# Altium footprint library Miscellaneous SMD.PcbLib: 82 footprints (part 4 of 7) (continued)
## JAE_DP3AR020SU32JQ1R400 [mm] "20 Positions, 0.6mm Pitch, ThunderboltTM Technology Compatible Right Angled Connector"
height 9.1
pads (26):
  rect 0.35x2 smd: 1(2.7,6) 3(2.1,6) 5(1.5,6) 7(0.9,6) 9(0.3,6) 11(-0.3,6) 13(-0.9,6) 15(-1.5,6) 17(-2.1,6) 19(-2.7,6)
  round 0.8 hole 0.5: 2(2.7,3.09) 4(2.3,2.09) 6(1.3,2.09) 8(0.9,3.09) 10(0.5,4.09) 12(-0.5,4.09) 14(-0.9,3.09) 16(-1.3,2.09) 18(-2.3,2.09) 20(-2.7,3.09)
  round 0.5 hole 1.4 unplated mask+0.45: P1(-4,0) P2(4,0)
  oval 1.2x2.3 hole 0.7 slot 1.8 at 90 deg: SHIELD(-4.56,-2.72) SHIELD(4.56,-2.72)
  oval 1.2x2.7 hole 0.7 slot 2.2 at 90 deg: SHIELD(-4.26,3.09) SHIELD(4.26,3.09)
Top Layer keep-out:
  lines w0.1: -5.1,-1.45 cw(c-4.56,-2.17) -3.912,-1.545 -3.54,-1.545 -3.54,-0.888 cw(c-4,0) -4.606,-0.795 -5.1,-0.795 -5.1,-1.45 ; -5.1,4.525 -4.844,4.525 cw(c-4.26,3.84) -3.75,4.582 -3.75,5.785 -5.1,5.785 -5.1,4.525 ; 3.54,-1.545 3.913,-1.545 cw(c4.56,-2.17) 5.1,-1.45 5.1,-0.795 4.607,-0.795 cw(c4,0) 3.54,-0.888 3.54,-1.545 ; 3.75,4.582 cw(c4.26,3.84) 4.844,4.525 5.1,4.525 5.1,5.785 3.75,5.785 3.75,4.582
Top Overlay:
  circle w0.25: c3.45,6.905 r0.125
  lines w0.2: -4.925,-1.239 -4.925,-0.595 ; -4.925,0.595 -4.925,1.593 ; -4.925,4.587 -4.925,5.9 -4.576,5.9 ; -4.61,4.777 -4.61,5.7 cw(c-4.01,5.7) -4.01,6.3 -3.275,6.3 ; -4.57,-4.27 -4.57,-5.02 ccw(c-4.17,-5.02) -4.17,-5.42 ; -4.21,4.839 -4.21,5.7 cw(c-4.01,5.7) -4.1,5.879 ; -4.15,-4.182 -4.15,-5.52 4.15,-5.52 4.15,-4.182 ; -4.15,-1.258 -4.15,-1.09 ; -4.15,1.09 -4.15,1.346 ; -4.1,4.827 -4.1,5.9 -3.275,5.9 ; 3.275,5.9 4.1,5.9 4.1,4.827 ; 3.275,6.3 4.01,6.3 cw(c4.01,5.7) 4.61,5.7 4.61,4.777 ; 4.1,5.879 cw(c4.01,5.7) 4.21,5.7 4.21,4.839 ; 4.15,-1.258 4.15,-1.09 ; 4.15,1.09 4.15,1.346 ; 4.17,-5.42 ccw(c4.17,-5.02) 4.57,-5.02 4.57,-4.27 ; 4.576,5.9 4.925,5.9 4.925,4.587 ; 4.925,-1.239 4.925,-0.595 ; 4.925,0.595 4.925,1.593 ; -3.001,-4.473 ccw(c-2.807,-4.52) -2.613,-4.567 -2.1,-2.47 -2.1,-0.84 -1.4,-0.84 -1.4,-2.47 -0.887,-4.567 ccw(c-0.693,-4.52) -0.499,-4.473 -1,-2.413 -1,-0.64 ccw(c-1.2,-0.64) -1.2,-0.44 -2.3,-0.44 ccw(c-2.3,-0.64) -2.5,-0.64 -2.5,-2.413 -3.001,-4.473 ; 0.499,-4.473 ccw(c0.693,-4.52) 0.887,-4.567 1.4,-2.47 1.4,-0.84 2.1,-0.84 2.1,-2.47 2.613,-4.567 ccw(c2.807,-4.52) 3.001,-4.473 2.5,-2.413 2.5,-0.64 ccw(c2.3,-0.64) 2.3,-0.44 1.2,-0.44 ccw(c1.2,-0.64) 1,-0.64 1,-2.413 0.499,-4.473
Mechanical 8:
  drawing of 224 lines, arcs and shapes, not listed
Mechanical 14:
  circle w0.25: c3.45,6.905 r0.125
  lines w0.1: -4.576,5.9 -4.925,5.9 -4.925,-1.37 -4.15,-1.37 ; -4.57,-3.22 -4.76,-3.22 -4.76,-2.22 -4.17,-2.22 -4.17,-5.02 -4.15,-5.02 ; -4.57,-2.22 -4.57,-5.02 ccw(c-4.17,-5.02) -4.17,-5.42 ; -4.145,3.418 -3.25,3.42 ccw(c-3.25,3.62) -3.05,3.62 -3.05,5.149 cw(c-2.85,5.149) -2.991,5.291 -2.732,5.55 -2.394,5.983 -2.355,6.126 -2.355,6.175 -2.366,6.202 -2.394,6.228 -2.503,6.278 -2.612,6.299 ; -4.1,3.42 -4.1,5.9 -2.458,5.9 ; -4.1,5.786 ccw(c-3.865,5.6) -4.15,5.694 -4.15,-5.52 4.15,-5.52 4.15,5.694 ccw(c3.865,5.6) 3.865,5.9 ; -4.1,5.879 ccw(c-4.01,5.7) -4.21,5.7 -4.21,3.08 -4.61,3.08 -4.61,5.7 cw(c-4.01,5.7) -4.01,6.3 4.01,6.3 cw(c4.01,5.7) 4.61,5.7 4.61,3.08 4.21,3.08 4.21,5.7 ccw(c4.01,5.7) 4.1,5.879 ; -2.825,6.3 -2.825,6.5 -2.575,6.5 -2.575,6.3 ; -2.225,6.3 -2.225,6.5 -1.975,6.5 -1.975,6.3 ; -1.723,5.9 1.722,5.9 ; -1.625,6.3 -1.625,6.5 -1.375,6.5 -1.375,6.3 ; -1.549,6.3 -1.67,6.282 -1.791,6.228 -1.82,6.178 -1.83,6.124 -1.831,6.062 -1.791,5.983 -1.622,5.777 -1.453,5.55 -1.356,5.454 ccw(c-1.215,5.595) -1.215,5.395 1.215,5.395 ccw(c1.215,5.595) 1.356,5.454 1.646,5.808 1.791,5.983 1.824,6.041 1.83,6.124 1.82,6.174 1.791,6.228 1.67,6.282 1.549,6.3 ; -1.025,6.3 -1.025,6.5 -0.775,6.5 -0.775,6.3 ; -0.425,6.3 -0.425,6.5 -0.175,6.5 -0.175,6.3 ; 0.175,6.3 0.175,6.5 0.425,6.5 0.425,6.3 ; 0.775,6.3 0.775,6.5 1.025,6.5 1.025,6.3 ; 1.375,6.3 1.375,6.5 1.625,6.5 1.625,6.3 ; 1.975,6.3 1.975,6.5 2.225,6.5 2.225,6.3 ; 2.462,5.9 4.1,5.9 4.1,3.42 ; 2.575,6.3 2.575,6.5 2.825,6.5 2.825,6.3 ; 2.641,6.3 2.503,6.278 2.394,6.228 2.362,6.193 2.353,6.155 2.357,6.096 2.394,5.983 2.563,5.777 2.732,5.55 2.862,5.42 2.991,5.291 cw(c2.85,5.149) 3.05,5.149 3.05,3.62 ccw(c3.25,3.62) 3.25,3.42 4.15,3.42 ; 4.15,-5.02 4.17,-5.02 4.17,-2.22 4.76,-2.22 4.76,-3.22 4.57,-3.22 ; 4.15,-1.37 4.925,-1.37 4.925,5.9 4.576,5.9 ; 4.17,-5.42 ccw(c4.17,-5.02) 4.57,-5.02 4.57,-2.22 ; -3.001,-4.473 ccw(c-2.807,-4.52) -2.613,-4.567 -2.1,-2.47 -2.1,-0.84 -1.4,-0.84 -1.4,-2.47 -0.887,-4.567 ccw(c-0.693,-4.52) -0.499,-4.473 -1,-2.413 -1,-0.64 ccw(c-1.2,-0.64) -1.2,-0.44 -2.3,-0.44 ccw(c-2.3,-0.64) -2.5,-0.64 -2.5,-2.413 -3.001,-4.473 ; 0.499,-4.473 ccw(c0.693,-4.52) 0.887,-4.567 1.4,-2.47 1.4,-0.84 2.1,-0.84 2.1,-2.47 2.613,-4.567 ccw(c2.807,-4.52) 3.001,-4.473 2.5,-2.413 2.5,-0.64 ccw(c2.3,-0.64) 2.3,-0.44 1.2,-0.44 ccw(c1.2,-0.64) 1,-0.64 1,-2.413 0.499,-4.473
Mechanical 15:
  lines w0.05: -5.175,-5.77 -5.175,7.25 5.175,7.25 5.175,-5.77 -5.175,-5.77
3D body "JAE_DP3AR020SU32JQ1R400.stp": height 5.9, standoff -2.55, extent -4.925,-5.52 4.925,6.5

## JAE_DP3R020RU32JQR400 [mm] "20 Positions, 0.6mm Pitch, ThunderboltTM Technology Compatible Right Angled Connector (Reverse Type)"
height 9.1
pads (26):
  round 0.8 hole 0.5: 1(-2.7,3.09) 3(-2.3,2.09) 5(-1.3,2.09) 7(-0.9,3.09) 9(-0.5,4.09) 11(0.5,4.09) 13(0.9,3.09) 15(1.3,2.09) 17(2.3,2.09) 19(2.7,3.09)
  rect 0.35x2 smd: 2(-2.7,6) 4(-2.1,6) 6(-1.5,6) 8(-0.9,6) 10(-0.3,6) 12(0.3,6) 14(0.9,6) 16(1.5,6) 18(2.1,6) 20(2.7,6)
  round 0.5 hole 1.4 unplated mask+0.45: P1(-4,0) P2(4,0)
  oval 1.2x2.3 hole 0.7 slot 1.8 at 90 deg: SHIELD(-4.56,-2.72) SHIELD(4.56,-2.72)
  oval 1.2x2.7 hole 0.7 slot 2.2 at 90 deg: SHIELD(-4.26,3.09) SHIELD(4.26,3.09)
Top Layer keep-out:
  lines w0.1: -5.1,-1.45 cw(c-4.56,-2.17) -3.912,-1.545 -3.54,-1.545 -3.54,-0.888 cw(c-4,0) -4.606,-0.795 -5.1,-0.795 -5.1,-1.45 ; -5.1,4.525 -4.844,4.525 cw(c-4.26,3.84) -3.75,4.582 -3.75,5.785 -5.1,5.785 -5.1,4.525 ; 3.54,-1.545 3.913,-1.545 cw(c4.56,-2.17) 5.1,-1.45 5.1,-0.795 4.607,-0.795 cw(c4,0) 3.54,-0.888 3.54,-1.545 ; 3.75,4.582 cw(c4.26,3.84) 4.844,4.525 5.1,4.525 5.1,5.785 3.75,5.785 3.75,4.582
Top Overlay:
  circle w0.25: c3.45,6.905 r0.125
  lines w0.2: -4.925,-1.239 -4.925,-0.595 ; -4.925,0.595 -4.925,1.593 ; -4.925,4.587 -4.925,5.9 -4.576,5.9 ; -4.61,4.777 -4.61,5.7 cw(c-4.01,5.7) -4.01,6.3 -3.275,6.3 ; -4.57,-4.27 -4.57,-5.02 ccw(c-4.17,-5.02) -4.17,-5.42 ; -4.21,4.839 -4.21,5.7 cw(c-4.01,5.7) -4.1,5.879 ; -4.17,-4.191 -4.17,-5.02 -4.15,-5.02 ; -4.15,-4.182 -4.15,-5.52 4.15,-5.52 4.15,-4.182 ; -4.15,-1.258 -4.15,-1.09 ; -4.15,1.09 -4.15,1.346 ; -4.1,4.827 -4.1,5.9 -3.275,5.9 ; 3.275,5.9 4.1,5.9 4.1,4.827 ; 3.275,6.3 4.01,6.3 cw(c4.01,5.7) 4.61,5.7 4.61,4.777 ; 4.1,5.879 cw(c4.01,5.7) 4.21,5.7 4.21,4.839 ; 4.15,-5.02 4.17,-5.02 4.17,-4.191 ; 4.15,-1.258 4.15,-1.09 ; 4.15,1.09 4.15,1.346 ; 4.17,-5.42 ccw(c4.17,-5.02) 4.57,-5.02 4.57,-4.27 ; 4.576,5.9 4.925,5.9 4.925,4.587 ; 4.925,-1.37 4.925,-0.595 ; 4.925,0.595 4.925,1.593 ; -1.3,-3.52 ccw(c-0.3,-3.52) -0.3,-4.52 0.3,-4.52 ccw(c0.3,-3.52) 1.3,-3.52 1.3,0.08 ccw(c1.1,0.08) 1.1,0.28 1.061,0.28 ccw(c1.061,0.08) 0.865,0.123 0.5,-1.52 0.5,-1.62 ccw(c0.7,-1.62) 0.7,-1.82 cw(c0.7,-2.02) 0.9,-2.02 0.9,-3.97 -0.9,-3.97 -0.9,-2.02 cw(c-0.7,-2.02) -0.7,-1.82 ccw(c-0.7,-1.62) -0.5,-1.62 -0.5,-1.52 -0.865,0.123 ccw(c-1.06,0.08) -1.06,0.28 -1.1,0.28 ccw(c-1.1,0.08) -1.3,0.08 -1.3,-3.52
Mechanical 8:
  drawing of 224 lines, arcs and shapes, not listed
Mechanical 14:
  circle w0.25: c3.45,6.905 r0.125
  lines w0.1: -4.576,5.9 -4.925,5.9 -4.925,-1.37 -4.15,-1.37 ; -4.57,-3.22 -4.76,-3.22 -4.76,-2.22 -4.17,-2.22 -4.17,-5.02 -4.15,-5.02 ; -4.57,-2.22 -4.57,-5.02 ccw(c-4.17,-5.02) -4.17,-5.42 ; -4.1,5.786 ccw(c-3.865,5.6) -4.15,5.694 -4.15,-5.52 4.15,-5.52 4.15,5.694 ccw(c3.865,5.6) 3.865,5.9 ; -4.1,5.879 ccw(c-4.01,5.7) -4.21,5.7 -4.21,3.08 -4.61,3.08 -4.61,5.7 cw(c-4.01,5.7) -4.01,6.3 4.01,6.3 cw(c4.01,5.7) 4.61,5.7 4.61,3.08 4.21,3.08 4.21,5.7 ccw(c4.01,5.7) 4.1,5.879 ; -2.825,6.3 -2.825,6.5 -2.575,6.5 -2.575,6.3 ; -2.225,6.3 -2.225,6.5 -1.975,6.5 -1.975,6.3 ; -2.1,5.9 -4.1,5.9 -4.1,3.42 -2.75,3.42 ccw(c-2.75,3.62) -2.55,3.62 -2.55,4.95 cw(c-2.342,4.947) -2.3,5.15 ccw(c-2.3,5.35) -2.1,5.35 -2.1,6.3 ; -1.625,6.3 -1.625,6.5 -1.375,6.5 -1.375,6.3 ; -1.1,5.9 1.1,5.9 ; -1.1,6.3 -1.1,5.3 ccw(c-0.95,5.3) -0.95,5.15 0.95,5.15 ccw(c0.95,5.3) 1.1,5.3 1.1,6.3 ; -1.025,6.3 -1.025,6.5 -0.775,6.5 -0.775,6.3 ; -0.425,6.3 -0.425,6.5 -0.175,6.5 -0.175,6.3 ; 0.175,6.3 0.175,6.5 0.425,6.5 0.425,6.3 ; 0.775,6.3 0.775,6.5 1.025,6.5 1.025,6.3 ; 1.375,6.3 1.375,6.5 1.625,6.5 1.625,6.3 ; 1.975,6.3 1.975,6.5 2.225,6.5 2.225,6.3 ; 2.1,5.9 4.1,5.9 4.1,3.42 2.75,3.42 cw(c2.75,3.62) 2.55,3.62 2.55,4.944 ; 2.1,6.3 2.1,5.35 ccw(c2.3,5.35) 2.3,5.15 cw(c2.343,4.947) 2.55,4.95 ; 2.575,6.3 2.575,6.5 2.825,6.5 2.825,6.3 ; 4.15,-5.02 4.17,-5.02 4.17,-2.22 4.76,-2.22 4.76,-3.22 4.57,-3.22 ; 4.15,-1.37 4.925,-1.37 4.925,5.9 4.576,5.9 ; 4.17,-5.42 ccw(c4.17,-5.02) 4.57,-5.02 4.57,-2.22 ; -1.3,-3.52 ccw(c-0.3,-3.52) -0.3,-4.52 0.3,-4.52 ccw(c0.3,-3.52) 1.3,-3.52 1.3,0.08 ccw(c1.1,0.08) 1.1,0.28 1.061,0.28 ccw(c1.061,0.08) 0.865,0.123 0.5,-1.52 0.5,-1.62 ccw(c0.7,-1.62) 0.7,-1.82 cw(c0.7,-2.02) 0.9,-2.02 0.9,-3.97 -0.9,-3.97 -0.9,-2.02 cw(c-0.7,-2.02) -0.7,-1.82 ccw(c-0.7,-1.62) -0.5,-1.62 -0.5,-1.52 -0.865,0.123 ccw(c-1.06,0.08) -1.06,0.28 -1.1,0.28 ccw(c-1.1,0.08) -1.3,0.08 -1.3,-3.52
Mechanical 15:
  lines w0.05: -5.175,-5.77 -5.175,7.25 5.175,7.25 5.175,-5.77 -5.175,-5.77
3D body "JAE_DP3R020RU32JQR400.stp": height 5.9, standoff -1.85, extent -4.925,-5.52 4.925,6.5

## JAE_KX15-20K4DE1000E [mm] "0.8mm Pitch, 20 Contacts Surface Mount Board to Board & Mezzanine Plug Connector"
height 6.05
pads (24):
  rect 0.5x2.1 smd: 1(-3.6,-2.25) 2(-3.6,2.25) 3(-2.8,-2.25) 4(-2.8,2.25) 5(-2,-2.25) 6(-2,2.25) 7(-1.2,-2.25) 8(-1.2,2.25) 9(-0.4,-2.25) 10(-0.4,2.25) 11(0.4,-2.25) 12(0.4,2.25) 13(1.2,-2.25) 14(1.2,2.25) 15(2,-2.25) 16(2,2.25) 17(2.8,-2.25) 18(2.8,2.25) 19(3.6,-2.25) 20(3.6,2.25)
  rect 2.5x3 smd: 21(8.1,0) 22(-8.1,0)
  round 0.5 hole 0.7 unplated mask+0.1: 23(4.35,0)
  round 0.5 hole 0.9 unplated mask+0.2: 24(-4.35,0)
Top Overlay:
  circle w0.25: c-4.65,-2.95 r0.125
  lines w0.2: -8,-1.9 -8,-2 ccw(c-7.5,-2) -7.5,-2.5 -6.55,-2.5 -6.55,-1.9 ; -8,1.9 -8,2 cw(c-7.5,2) -7.5,2.5 -6.55,2.5 -6.55,1.9 ; -6.55,-2.05 -4.25,-2.05 ; -6.55,2.05 -4.25,2.05 ; -6.45,-0.15 -5.8,-0.15 ; -6.45,1.25 -5.8,1.25 ; -5.712,-0.862 -5.3,-0.45 ; -5.712,1.962 -5.3,1.55 ; -5.5,2.05 ccw(c-5.5,1.75) -5.8,1.75 -5.8,-0.65 ccw(c-5.5,-0.65) -5.5,-0.95 -4.6,-0.95 -4.6,-1.85 ; -5,-0.374 -5,-0.95 -5.1,-0.45 ; -5,0.374 -5,1.85 ; -5,2.05 -5.1,1.55 ; -4.96,2.05 -5,1.85 ; -4.8,-0.95 -4.8,-2.05 -4.6,-1.85 ; -4.525,-0.729 -4.525,-1.375 ; -4.525,0.729 -4.525,1.375 ; -4.25,-1.85 -4.6,-1.85 ; -4.25,-1.375 -4.525,-1.375 ; -4.25,-1.225 -4.502,-1.225 -4.525,-1.375 ; -4.25,1.225 -4.502,1.225 -4.525,1.375 ; -4.25,1.375 -4.525,1.375 ; -4.25,1.85 -5,1.85 ; 4.25,-2.05 6.55,-2.05 ; 4.25,-1.85 4.6,-1.85 ; 4.25,-1.375 4.525,-1.375 ; 4.25,-1.225 4.502,-1.225 4.525,-1.375 ; 4.25,1.225 4.502,1.225 4.525,1.375 ; 4.25,1.375 4.525,1.375 ; 4.25,1.85 5,1.85 ; 4.25,2.05 6.55,2.05 ; 4.525,-0.729 4.525,-1.375 ; 4.525,0.729 4.525,1.375 ; 4.8,-0.95 4.8,-2.05 4.6,-1.85 ; 4.96,2.05 5,1.85 ; 5,-0.374 5,-0.95 5.1,-0.45 ; 5,0.374 5,1.85 ; 5,2.05 5.1,1.55 ; 5.476,2.049 cw(c5.5,1.75) 5.8,1.75 5.8,-0.65 cw(c5.5,-0.65) 5.5,-0.95 4.6,-0.95 4.6,-1.85 ; 5.712,-0.862 5.3,-0.45 ; 5.712,1.962 5.3,1.55 ; 5.8,-0.15 6.45,-0.15 ; 5.8,1.25 6.45,1.25 ; 6.55,-1.9 6.55,-2.5 7.5,-2.5 ccw(c7.5,-2) 8,-2 8,-1.9 ; 6.55,1.9 6.55,2.5 7.5,2.5 cw(c7.5,2) 8,2 8,1.9 ; -5.3,-0.45 -5.3,1.55 ; -5.3,-0.45 -5.1,-0.45 ; -5.3,1.55 -5.1,1.55 ; -5.1,-0.45 -5.1,1.55 ; 5.1,-0.45 5.1,1.55 ; 5.1,-0.45 5.3,-0.45 ; 5.1,1.55 5.3,1.55 ; 5.3,-0.45 5.3,1.55
Mechanical 8:
  drawing of 192 lines, arcs and shapes, not listed
Mechanical 14:
  circle w0.25: c-4.65,-2.95 r0.125
  lines w0.1: -8,-0.95 -8.7,-0.95 -8.7,0.95 -8,0.95 ; -6.55,-2.05 6.55,-2.05 ; -6.55,2.05 6.55,2.05 ; -5.8,-0.15 -6.55,-0.15 -6.55,-2.5 -7.5,-2.5 cw(c-7.5,-2) -8,-2 -8,2 cw(c-7.5,2) -7.5,2.5 -6.55,2.5 -6.55,1.25 -5.8,1.25 ; -5.712,-0.862 -5.3,-0.45 ; -5.712,1.962 -5.3,1.55 ; -5.5,2.05 ccw(c-5.5,1.75) -5.8,1.75 -5.8,-0.65 ccw(c-5.5,-0.65) -5.5,-0.95 -4.6,-0.95 -4.6,-1.85 ; -5,2.05 -5.1,1.55 ; -4.96,2.05 -5,1.85 ; -4.8,-0.95 -4.8,-2.05 -4.6,-1.85 ; -4.225,-1.225 -4.225,1.225 ; -4.225,-1.025 4.225,-1.025 ; -4.225,1.025 4.225,1.025 ; -3.725,-2.05 -3.725,-2.75 -3.475,-2.75 -3.475,-2.05 ; -3.725,2.05 -3.725,2.75 -3.475,2.75 -3.475,2.05 ; -2.925,-2.05 -2.925,-2.75 -2.675,-2.75 -2.675,-2.05 ; -2.925,2.05 -2.925,2.75 -2.675,2.75 -2.675,2.05 ; -2.125,-2.05 -2.125,-2.75 -1.875,-2.75 -1.875,-2.05 ; -2.125,2.05 -2.125,2.75 -1.875,2.75 -1.875,2.05 ; -1.325,-2.05 -1.325,-2.75 -1.075,-2.75 -1.075,-2.05 ; -1.325,2.05 -1.325,2.75 -1.075,2.75 -1.075,2.05 ; -0.525,-2.05 -0.525,-2.75 -0.275,-2.75 -0.275,-2.05 ; -0.525,2.05 -0.525,2.75 -0.275,2.75 -0.275,2.05 ; 0.275,-2.05 0.275,-2.75 0.525,-2.75 0.525,-2.05 ; 0.275,2.05 0.275,2.75 0.525,2.75 0.525,2.05 ; 1.075,-2.05 1.075,-2.75 1.325,-2.75 1.325,-2.05 ; 1.075,2.05 1.075,2.75 1.325,2.75 1.325,2.05 ; 1.875,-2.05 1.875,-2.75 2.125,-2.75 2.125,-2.05 ; 1.875,2.05 1.875,2.75 2.125,2.75 2.125,2.05 ; 2.675,-2.05 2.675,-2.75 2.925,-2.75 2.925,-2.05 ; 2.675,2.05 2.675,2.75 2.925,2.75 2.925,2.05 ; 3.475,-2.05 3.475,-2.75 3.725,-2.75 3.725,-2.05 ; 3.475,2.05 3.475,2.75 3.725,2.75 3.725,2.05 ; 4.225,-1.225 4.225,1.225 ; 4.8,-0.95 4.8,-2.05 4.6,-1.85 ; 4.96,2.05 5,1.85 ; 5,2.05 5.1,1.55 ; 5.476,2.049 cw(c5.5,1.75) 5.8,1.75 5.8,-0.65 cw(c5.5,-0.65) 5.5,-0.95 4.6,-0.95 4.6,-1.85 ; 5.712,-0.862 5.3,-0.45 ; 5.712,1.962 5.3,1.55 ; 5.8,-0.15 6.55,-0.15 6.55,-2.5 7.5,-2.5 ccw(c7.5,-2) 8,-2 8,2 ccw(c7.5,2) 7.5,2.5 6.55,2.5 6.55,1.25 5.8,1.25 ; 8,-0.95 8.7,-0.95 8.7,0.95 8,0.95 ; -5.3,-0.45 -5.3,1.55 ; -5.3,-0.45 -5.1,-0.45 ; -5.3,1.55 -5.1,1.55 ; -5.1,-0.45 -5,-0.95 -5,1.85 ; -5.1,-0.45 -5.1,1.55 ; -5,1.85 5,1.85 ; -4.6,-1.85 4.6,-1.85 ; -4.525,-1.375 -4.502,-1.225 4.502,-1.225 4.525,-1.375 ; -4.525,-1.375 4.525,-1.375 ; -4.525,-1.375 -4.525,1.375 ; -4.525,1.375 -4.502,1.225 4.502,1.225 4.525,1.375 ; -4.525,1.375 4.525,1.375 ; 4.525,-1.375 4.525,1.375 ; 5,1.85 5,-0.95 5.1,-0.45 ; 5.1,-0.45 5.1,1.55 ; 5.1,-0.45 5.3,-0.45 ; 5.1,1.55 5.3,1.55 ; 5.3,-0.45 5.3,1.55
Mechanical 15:
  lines w0.05: -9.6,-3.55 -9.6,3.55 9.6,3.55 9.6,-3.55 -9.6,-3.55
3D body "JAE_KX15-20K4DE1000E.stp": height 5.75, standoff -0.6, extent -8.7,-2.75 8.7,2.75

## JOHNSON_142-0701-871 [mm] "SMA End Launch Straight Bulkhead Jack Receptacle - Round Contact"
height 8.05
pads (5):
  rect 5x2.794 smd: 1(0,0)
  rect 5x2.4 smd: 2(0,-4.317) 2(0,4.317)
  rect 5x2.4 smd far side: 2(0,-4.317) 2(0,4.317)
Top Overlay:
  lines w0.2: -14.73,-2.5 -15.526,-2.5 -15.526,2.5 -14.73,2.5 ; -5.85,-2.5 -4.35,-2.5 ; -5.85,2.5 -4.35,2.5 ; -14.38,-3.11 -14.38,3.11 ; -14.38,-3.11 -14.73,-2.51 -14.73,2.51 -14.38,3.11 ; -14.38,-3.11 -6.2,-3.11 ; -14.38,3.11 -6.2,3.11 ; -6.2,-3.11 -6.2,3.11 ; -6.2,-3.11 -5.85,-2.51 -5.85,2.51 -6.2,3.11 ; -4.35,-4.825 -2.7,-4.825 -2.7,4.825 -4.35,4.825 -4.35,-4.825
Mechanical 8:
  lines w0.1: -1,-4.317 0,-4.317 ; -1,0 0,0 ; -1,4.317 0,4.317 ; 0,-5.317 0,-4.317 ; 0,-3.317 0,-4.317 ; 0,-1 0,0 ; 0,1 0,0 ; 0,3.317 0,4.317 ; 0,5.317 0,4.317 ; 1,-4.317 0,-4.317 ; 1,0 0,0 ; 1,4.317 0,4.317
Mechanical 14:
  lines w0.1: -14.73,-2.5 -15.526,-2.5 -15.526,2.5 -14.73,2.5 ; -5.85,-2.5 -4.35,-2.5 ; -5.85,2.5 -4.35,2.5 ; -2.7,-3.809 2.05,-3.809 2.05,-4.825 -2.7,-4.825 ; -2.7,-0.381 2.054,-0.381 2.054,0.381 -2.696,0.381 ; -2.7,3.809 2.05,3.809 2.05,4.825 -2.7,4.825 ; -14.38,-3.11 -14.38,3.11 ; -14.38,-3.11 -14.73,-2.51 -14.73,2.51 -14.38,3.11 ; -14.38,-3.11 -6.2,-3.11 ; -14.38,3.11 -6.2,3.11 ; -6.2,-3.11 -6.2,3.11 ; -6.2,-3.11 -5.85,-2.51 -5.85,2.51 -6.2,3.11 ; -2.7,-4.825 -2.7,4.825 ; -2.7,-4.825 -4.35,-4.825 -4.35,4.825 -2.7,4.825
3D body "JOHNSON_142-0701-871_Part2.stp": height 5.56, standoff -4.64, extent -10.13,-5.1 -7.11,5.1
3D body "JOHNSON_142-0701-871_Part1.stp": height 4.48, standoff -3.57, extent -15.526,-4.825 2.054,4.825

## JOHNSON_142-0701-873 [mm] "SMA End Launch Straight Bulkhead Jack Receptacle - Round Contact"
height 8.05
pads (5):
  rect 5x2.794 smd: 1(0,0)
  rect 5x2.4 smd: 2(0,-4.317) 2(0,4.317)
  rect 5x2.4 smd far side: 2(0,-4.317) 2(0,4.317)
Top Overlay:
  lines w0.2: -14.73,-2.5 -15.526,-2.5 -15.526,2.5 -14.73,2.5 ; -5.85,-2.5 -4.35,-2.5 ; -5.85,2.5 -4.35,2.5 ; -14.38,-3.11 -14.38,3.11 ; -14.38,-3.11 -14.73,-2.51 -14.73,2.51 -14.38,3.11 ; -14.38,-3.11 -6.2,-3.11 ; -14.38,3.11 -6.2,3.11 ; -6.2,-3.11 -6.2,3.11 ; -6.2,-3.11 -5.85,-2.51 -5.85,2.51 -6.2,3.11 ; -4.35,-4.825 -2.7,-4.825 -2.7,4.825 -4.35,4.825 -4.35,-4.825
Mechanical 8:
  lines w0.1: -1,-4.317 0,-4.317 ; -1,0 0,0 ; -1,4.317 0,4.317 ; 0,-5.317 0,-4.317 ; 0,-3.317 0,-4.317 ; 0,-1 0,0 ; 0,1 0,0 ; 0,3.317 0,4.317 ; 0,5.317 0,4.317 ; 1,-4.317 0,-4.317 ; 1,0 0,0 ; 1,4.317 0,4.317
Mechanical 14:
  lines w0.1: -14.73,-2.5 -15.526,-2.5 -15.526,2.5 -14.73,2.5 ; -5.85,-2.5 -4.35,-2.5 ; -5.85,2.5 -4.35,2.5 ; -2.7,-3.809 2.05,-3.809 2.05,-4.825 -2.7,-4.825 ; -2.7,-0.381 2.054,-0.381 2.054,0.381 -2.696,0.381 ; -2.7,3.809 2.05,3.809 2.05,4.825 -2.7,4.825 ; -14.38,-3.11 -14.38,3.11 ; -14.38,-3.11 -14.73,-2.51 -14.73,2.51 -14.38,3.11 ; -14.38,-3.11 -6.2,-3.11 ; -14.38,3.11 -6.2,3.11 ; -6.2,-3.11 -6.2,3.11 ; -6.2,-3.11 -5.85,-2.51 -5.85,2.51 -6.2,3.11 ; -2.7,-4.825 -2.7,4.825 ; -2.7,-4.825 -4.35,-4.825 -4.35,4.825 -2.7,4.825
3D body "JOHNSON_142-0701-873_Part1.stp": height 4.48, standoff -3.57, extent -15.526,-4.825 2.054,4.825
3D body "JOHNSON_142-0701-873_Part2.stp": height 5.56, standoff -4.64, extent -9.75,-5.1 -7.53,5.1

## JOHNSON_142-0711-201 [mm] "SMA 50 Ohm Straight Jack Receptacle - Surface Mount"
height 8.84
pads (5):
  round 1.73 smd: 1(0,0)
  rect 2.35x1.9 smd: 2(-2.38,-2.6) 2(-2.38,2.6) 2(2.38,-2.6) 2(2.38,2.6)
Top Layer:
  region: 1.205,-3.555 3.555,-3.555 3.555,3.555 1.205,3.555 1.205,1.652 1.331,1.553 1.557,1.326 1.745,1.067 1.89,0.781 1.989,0.476 2.039,0.16 2.039,-0.16 1.989,-0.476 1.89,-0.781 1.745,-1.067 1.557,-1.326 1.331,-1.553 1.205,-1.652
  region: -3.555,-3.555 -1.205,-3.555 -1.205,-1.652 -1.331,-1.553 -1.557,-1.326 -1.745,-1.067 -1.89,-0.781 -1.989,-0.476 -2.039,-0.16 -2.039,0.16 -1.989,0.476 -1.89,0.781 -1.745,1.067 -1.557,1.326 -1.331,1.553 -1.205,1.652 -1.205,3.555 -3.555,3.555
Top Overlay:
  lines w0.2: -3.175,-0.905 -3.175,0.905 ; -2.491,-0.905 cw(c0,0) -2.491,0.905 ; -2.162,-0.78 cw(c0,0.005) -2.162,0.79 ; -0.905,-3.175 0.905,-3.175 ; -0.905,-2.491 ccw(c0,0) 0.905,-2.491 ; -0.905,2.491 cw(c0,0) 0.905,2.491 ; -0.905,3.175 0.905,3.175 ; -0.79,-2.162 ccw(c-0.005,0) 0.78,-2.162 ; -0.79,2.162 cw(c-0.005,0) 0.78,2.162 ; 2.162,-0.78 ccw(c0,0.005) 2.162,0.79 ; 2.491,-0.905 ccw(c0,0) 2.491,0.905 ; 3.175,-0.905 3.175,0.905
Top Solder:
  region: -3.655,-3.655 -3.655,-1.105 -1.601,-1.105 -1.549,-1.176 -1.436,-1.312 -1.312,-1.436 -1.176,-1.549 -1.105,-1.601 -1.105,-3.655
  region: 1.105,-3.655 1.105,-1.601 1.176,-1.549 1.312,-1.436 1.436,-1.312 1.549,-1.176 1.601,-1.105 3.655,-1.105 3.655,-3.655
  region: -3.655,1.105 -1.601,1.105 -1.549,1.176 -1.436,1.312 -1.312,1.436 -1.176,1.549 -1.105,1.601 -1.105,3.655 -3.655,3.655
  region: 1.105,1.601 1.176,1.549 1.312,1.436 1.436,1.312 1.549,1.176 1.601,1.105 3.655,1.105 3.655,3.655 1.105,3.655
Mechanical 8:
  lines w0.1: -3.38,-2.38 -2.38,-2.38 ; -3.38,2.38 -2.38,2.38 ; -2.38,-3.38 -2.38,-2.38 ; -2.38,-1.38 -2.38,-2.38 ; -2.38,1.38 -2.38,2.38 ; -2.38,3.38 -2.38,2.38 ; -1.38,-2.38 -2.38,-2.38 ; -1.38,2.38 -2.38,2.38 ; -1,0 0,0 ; 0,-1 0,0 ; 0,1 0,0 ; 1,0 0,0 ; 1.38,-2.38 2.38,-2.38 ; 1.38,2.38 2.38,2.38 ; 2.38,-3.38 2.38,-2.38 ; 2.38,-1.38 2.38,-2.38 ; 2.38,1.38 2.38,2.38 ; 2.38,3.38 2.38,2.38 ; 3.38,-2.38 2.38,-2.38 ; 3.38,2.38 2.38,2.38 ; -3.175,-3.175 -3.175,-1.585 -1.585,-1.585 -1.585,-3.175 -3.175,-3.175 ; -3.175,1.585 -3.175,3.175 -1.585,3.175 -1.585,1.585 -3.175,1.585 ; 1.585,-3.175 3.175,-3.175 3.175,-1.585 1.585,-1.585 1.585,-3.175 ; 1.585,1.585 3.175,1.585 3.175,3.175 1.585,3.175 1.585,1.585
Mechanical 14:
  circle w0.1: c0,0 r0.635
  circle w0.1: c0,0 r2.65
  circle w0.1: c0,0 r2.3
  lines w0.1: 3.175,-3.175 -3.175,-3.175 -3.175,3.175 3.175,3.175 ; 3.175,-3.175 3.175,3.175 ; 3.175,-3.175 3.175,3.175
Mechanical 15:
  circle w0.1: c0,0 r0.865
  lines w0.05: -3.805,-3.805 -3.805,3.805 3.805,3.805 3.805,-3.805 -3.805,-3.805
3D body "JOHNSON_142-0711-201.stp": height 8.84, standoff 0, extent -3.175,-3.175 3.175,3.175

## JOHNSON_142-0711-301 [mm] "SMA 50 Ohm Right Angle Jack Receptacle - Surface Mount"
height 8.26
pads (3):
  round 1.73 smd: 1(0,0)
  rect 1x1 smd: 2(-2.6,-2.38) 2(-2.6,2.38)
Top Layer:
  region: 3.555,1.205 3.555,3.555 -3.555,3.555 -3.555,1.205 -1.652,1.205 -1.553,1.331 -1.326,1.557 -1.067,1.745 -0.781,1.89 -0.476,1.989 -0.16,2.039 0.16,2.039 0.476,1.989 0.781,1.89 1.067,1.745 1.326,1.557 1.553,1.331 1.652,1.205
  region: 3.555,-3.555 3.555,-1.205 1.652,-1.205 1.553,-1.331 1.326,-1.557 1.067,-1.745 0.781,-1.89 0.476,-1.989 0.16,-2.039 -0.16,-2.039 -0.476,-1.989 -0.781,-1.89 -1.067,-1.745 -1.326,-1.557 -1.553,-1.331 -1.652,-1.205 -3.555,-1.205 -3.555,-3.555
Top Overlay:
  lines w0.2: -3.175,-0.805 -3.175,0.805 ; 3.175,-0.805 3.175,0.7 ; 3.955,-2.65 5.365,-2.65 ; 3.955,2.65 5.365,2.65 5.815,3.1 ; 5.365,-2.65 5.815,3.1 ; 5.365,-2.65 5.815,-3.1 ; 5.815,-3.1 6.265,2.65 ; 5.815,-3.1 6.265,-2.65 ; 5.815,3.1 6.265,2.65 ; 6.265,-2.65 6.715,3.1 ; 6.265,-2.65 6.715,-3.1 ; 6.265,2.65 6.715,3.1 ; 6.715,-3.1 7.165,2.65 ; 6.715,-3.1 7.165,-2.65 ; 6.715,3.1 7.165,2.65 ; 7.165,-2.65 7.615,3.1 ; 7.165,-2.65 7.615,-3.1 ; 7.165,2.65 7.615,3.1 ; 7.615,-3.1 8.065,2.65 ; 7.615,-3.1 8.065,-2.65 ; 7.615,3.1 8.065,2.65 ; 8.065,-2.65 8.515,3.1 ; 8.065,-2.65 8.515,-3.1 ; 8.065,2.65 8.515,3.1 ; 8.515,-3.1 8.965,2.65 ; 8.515,-3.1 8.965,-2.65 10.165,-2.65 10.165,2.65 8.965,2.65 ; 8.515,3.1 8.965,2.65
Mechanical 7:
  lines w0.1: -3.555,-3.555 3.555,-3.555 3.555,-1.205 1.652,-1.205 cw(c0,0) -1.652,-1.205 -3.555,-1.205 -3.555,-3.555 ; -3.555,1.205 -1.652,1.205 cw(c0,0) 1.652,1.205 3.555,1.205 3.555,3.555 -3.555,3.555 -3.555,1.205
Mechanical 8:
  lines w0.1: -3.38,-2.38 -2.38,-2.38 ; -3.38,2.38 -2.38,2.38 ; -3.175,-1.585 -1.585,-1.585 -1.585,-3.175 ; -3.175,1.585 -1.585,1.585 -1.585,3.175 ; -2.38,-3.38 -2.38,-2.38 ; -2.38,-1.38 -2.38,-2.38 ; -2.38,1.38 -2.38,2.38 ; -2.38,3.38 -2.38,2.38 ; -1.38,-2.38 -2.38,-2.38 ; -1.38,2.38 -2.38,2.38 ; -1,0 0,0 ; 0,-1 0,0 ; 0,1 0,0 ; 1,0 0,0 ; 1.38,-2.38 2.38,-2.38 ; 1.38,2.38 2.38,2.38 ; 1.585,-3.175 1.585,-1.585 3.175,-1.585 ; 1.585,3.175 1.585,1.585 3.175,1.585 ; 2.38,-3.38 2.38,-2.38 ; 2.38,-1.38 2.38,-2.38 ; 2.38,1.38 2.38,2.38 ; 2.38,3.38 2.38,2.38 ; 3.38,-2.38 2.38,-2.38 ; 3.38,2.38 2.38,2.38 ; -3.555,-3.555 -3.555,-1.205 -1.652,-1.205 ccw(c0,0) -1.205,-1.652 -1.205,-3.555 -3.555,-3.555 ; -3.555,1.205 -1.652,1.205 cw(c0,0) -1.205,1.652 -1.205,3.555 -3.555,3.555 -3.555,1.205 ; 1.205,-3.555 3.555,-3.555 3.555,-1.205 1.652,-1.205 cw(c0,0) 1.205,-1.652 1.205,-3.555 ; 1.205,1.652 cw(c0,0) 1.652,1.205 3.555,1.205 3.555,3.555 1.205,3.555 1.205,1.652
Mechanical 14:
  circle w0.1: c0,0 r0.635
  lines w0.1: 3.175,-2.65 5.365,-2.65 ; 3.175,2.65 5.365,2.65 5.815,3.1 ; -3.175,-3.175 3.175,-3.175 ; -3.175,-3.175 3.175,-3.175 ; -3.175,-3.175 -3.175,3.175 3.175,3.175 3.175,-3.175 ; 5.365,-2.65 5.815,3.1 ; 5.365,-2.65 5.815,-3.1 ; 5.815,-3.1 6.265,2.65 ; 5.815,-3.1 6.265,-2.65 ; 5.815,3.1 6.265,2.65 ; 6.265,-2.65 6.715,3.1 ; 6.265,-2.65 6.715,-3.1 ; 6.265,2.65 6.715,3.1 ; 6.715,-3.1 7.165,2.65 ; 6.715,-3.1 7.165,-2.65 ; 6.715,3.1 7.165,2.65 ; 7.165,-2.65 7.615,3.1 ; 7.165,-2.65 7.615,-3.1 ; 7.165,2.65 7.615,3.1 ; 7.615,-3.1 8.065,2.65 ; 7.615,-3.1 8.065,-2.65 ; 7.615,3.1 8.065,2.65 ; 8.065,-2.65 8.515,3.1 ; 8.065,-2.65 8.515,-3.1 ; 8.065,2.65 8.515,3.1 ; 8.515,-3.1 8.965,2.65 ; 8.515,-3.1 8.965,-2.65 10.165,-2.65 10.165,2.65 8.965,2.65 ; 8.515,3.1 8.965,2.65
Mechanical 15:
  circle w0.05: c0,0 r0.865
  lines w0.05: -3.805,-3.805 3.805,-3.805 3.805,3.805 -3.805,3.805 -3.805,-3.805
3D body "JOHNSON_142-0711-301.stp": height 8.26, standoff 0, extent -3.175,-3.175 10.165,3.175

## JOHNSON_142-0761-821 [mm] "SMA 50 Ohm End Launch Jack Receptacle"
height 5.53
pads (7):
  rect 1x0.724 smd: 1(0,0)
  round 1.6 hole 1.1: 2(1.15,-1.435) 2(1.15,1.435) 2(3.36,-1.435) 2(3.36,1.435)
  rect 5.5x3.44 smd: 2(2.15,-2.338) 2(2.15,2.328)
Top Overlay:
  lines w0.2: -9.324,-2.5 -10.12,-2.5 -10.12,2.5 -9.324,2.5 -9.324,-2.51 -8.974,-3.11 -8.934,-3.11 -8.584,-2.51 -8.234,-3.11 -8.194,-3.11 -7.844,-2.51 -7.494,-3.11 -7.454,-3.11 -7.104,-2.51 -6.754,-3.11 -6.714,-3.11 -6.364,-2.51 -6.014,-3.11 -5.974,-3.11 -5.624,-2.51 -5.274,-3.11 -5.234,-3.11 -4.884,-2.51 -4.884,2.51 -5.234,3.11 -5.274,3.11 -5.624,2.51 -5.974,3.11 -6.014,3.11 -6.364,2.51 -6.714,3.11 -6.754,3.11 -7.104,2.51 -7.454,3.11 -7.494,3.11 -7.844,2.51 -8.194,3.11 -8.234,3.11 -8.584,2.51 -8.934,3.11 -8.974,3.11 -9.324,2.51 ; -8.954,-3.11 -8.954,3.11 ; -8.214,-3.11 -8.214,3.11 ; -7.474,-3.11 -7.474,3.11 ; -6.734,-3.11 -6.734,3.11 ; -5.994,-3.11 -5.994,3.11 ; -5.254,-3.11 -5.254,3.11 ; -4.884,-2.5 -2.885,-2.5 ; -4.884,2.5 -2.885,2.5 ; -2.62,-1.477 -0.9,-1.477 ; -2.62,1.477 -0.9,1.477 ; -0.9,-3.135 -2.62,-3.135 ; -0.9,3.135 -2.62,3.135 ; -2.885,-2.5 -2.885,2.5 ; -2.885,-2.5 -2.62,-3.135 ; -2.885,2.5 -2.62,3.135 ; -2.62,-3.135 -2.62,3.135
Mechanical 8:
  lines w0.1: -0.6,-0.616 4.9,-0.616 4.9,-4.06 -0.6,-4.06 -0.6,4.04 4.9,4.04 4.9,0.616 -0.6,0.616 ; -0.5,0 0,0 ; 0,-0.5 0,0 ; 0,0.5 0,0 ; 0.5,0 0,0 ; 0.65,-1.435 1.15,-1.435 ; 0.65,1.435 1.15,1.435 ; 1.15,-1.935 1.15,-1.435 ; 1.15,-0.935 1.15,-1.435 ; 1.15,0.935 1.15,1.435 ; 1.15,1.935 1.15,1.435 ; 1.65,-2.338 2.15,-2.338 ; 1.65,-1.435 1.15,-1.435 ; 1.65,1.435 1.15,1.435 ; 1.65,2.328 2.15,2.328 ; 2.15,-2.838 2.15,-2.338 ; 2.15,-1.838 2.15,-2.338 ; 2.15,1.828 2.15,2.328 ; 2.15,2.828 2.15,2.328 ; 2.65,-2.338 2.15,-2.338 ; 2.65,2.328 2.15,2.328 ; 2.86,-1.435 3.36,-1.435 ; 2.86,1.435 3.36,1.435 ; 3.36,-1.935 3.36,-1.435 ; 3.36,-0.935 3.36,-1.435 ; 3.36,0.935 3.36,1.435 ; 3.36,1.935 3.36,1.435 ; 3.86,-1.435 3.36,-1.435 ; 3.86,1.435 3.36,1.435 ; -0.5,-0.362 0.5,-0.362 0.5,0.362 -0.5,0.362 -0.5,-0.362
Mechanical 14:
  lines w0.1: -9.324,-2.5 -10.12,-2.5 -10.12,2.5 -9.324,2.5 -9.324,-2.51 -8.974,-3.11 -8.934,-3.11 -8.584,-2.51 -8.234,-3.11 -8.194,-3.11 -7.844,-2.51 -7.494,-3.11 -7.454,-3.11 -7.104,-2.51 -6.754,-3.11 -6.714,-3.11 -6.364,-2.51 -6.014,-3.11 -5.974,-3.11 -5.624,-2.51 -5.274,-3.11 -5.234,-3.11 -4.884,-2.51 -4.884,2.51 -5.234,3.11 -5.274,3.11 -5.624,2.51 -5.974,3.11 -6.014,3.11 -6.364,2.51 -6.714,3.11 -6.754,3.11 -7.104,2.51 -7.454,3.11 -7.494,3.11 -7.844,2.51 -8.194,3.11 -8.234,3.11 -8.584,2.51 -8.934,3.11 -8.974,3.11 -9.324,2.51 ; -8.954,-3.11 -8.954,3.11 ; -8.214,-3.11 -8.214,3.11 ; -7.474,-3.11 -7.474,3.11 ; -6.734,-3.11 -6.734,3.11 ; -5.994,-3.11 -5.994,3.11 ; -5.254,-3.11 -5.254,3.11 ; -4.884,-2.5 -2.885,-2.5 ; -4.884,2.5 -2.885,2.5 ; -2.62,-1.477 -0.6,-1.477 ; -2.62,1.477 -0.6,1.477 ; -0.6,-3.135 -0.6,3.135 ; -0.6,-0.85 3.95,-0.85 3.95,-3.135 -2.62,-3.135 ; -0.6,-0.6 -0.5,-0.6 -0.5,0.6 -0.6,0.6 ; -0.6,0.85 3.95,0.85 3.95,3.135 -2.62,3.135 ; -0.5,-0.19 0.16,-0.19 0.16,0.19 -0.5,0.19 ; -2.885,-2.5 -2.885,2.5 ; -2.885,-2.5 -2.62,-3.135 ; -2.885,2.5 -2.62,3.135 ; -2.62,-3.135 -2.62,3.135
3D body "JOHNSON_142-0761-821.stp": height 3.3, standoff -2.92, extent -10.12,-3.135 3.95,3.135